# Altium footprint library RPSLib_orignal.PcbLib: 199 footprints (part 2 of 13)
Each footprint in its own frame and in the unit in brackets; x right, y up, seen from the top. Pads: shape width x height; smd on the part's side, far side on the other; paste and mask are expansions set on the pad; w line width, h text height; cw(c..) or ccw(c..) is an arc to the next point about the centre after c.
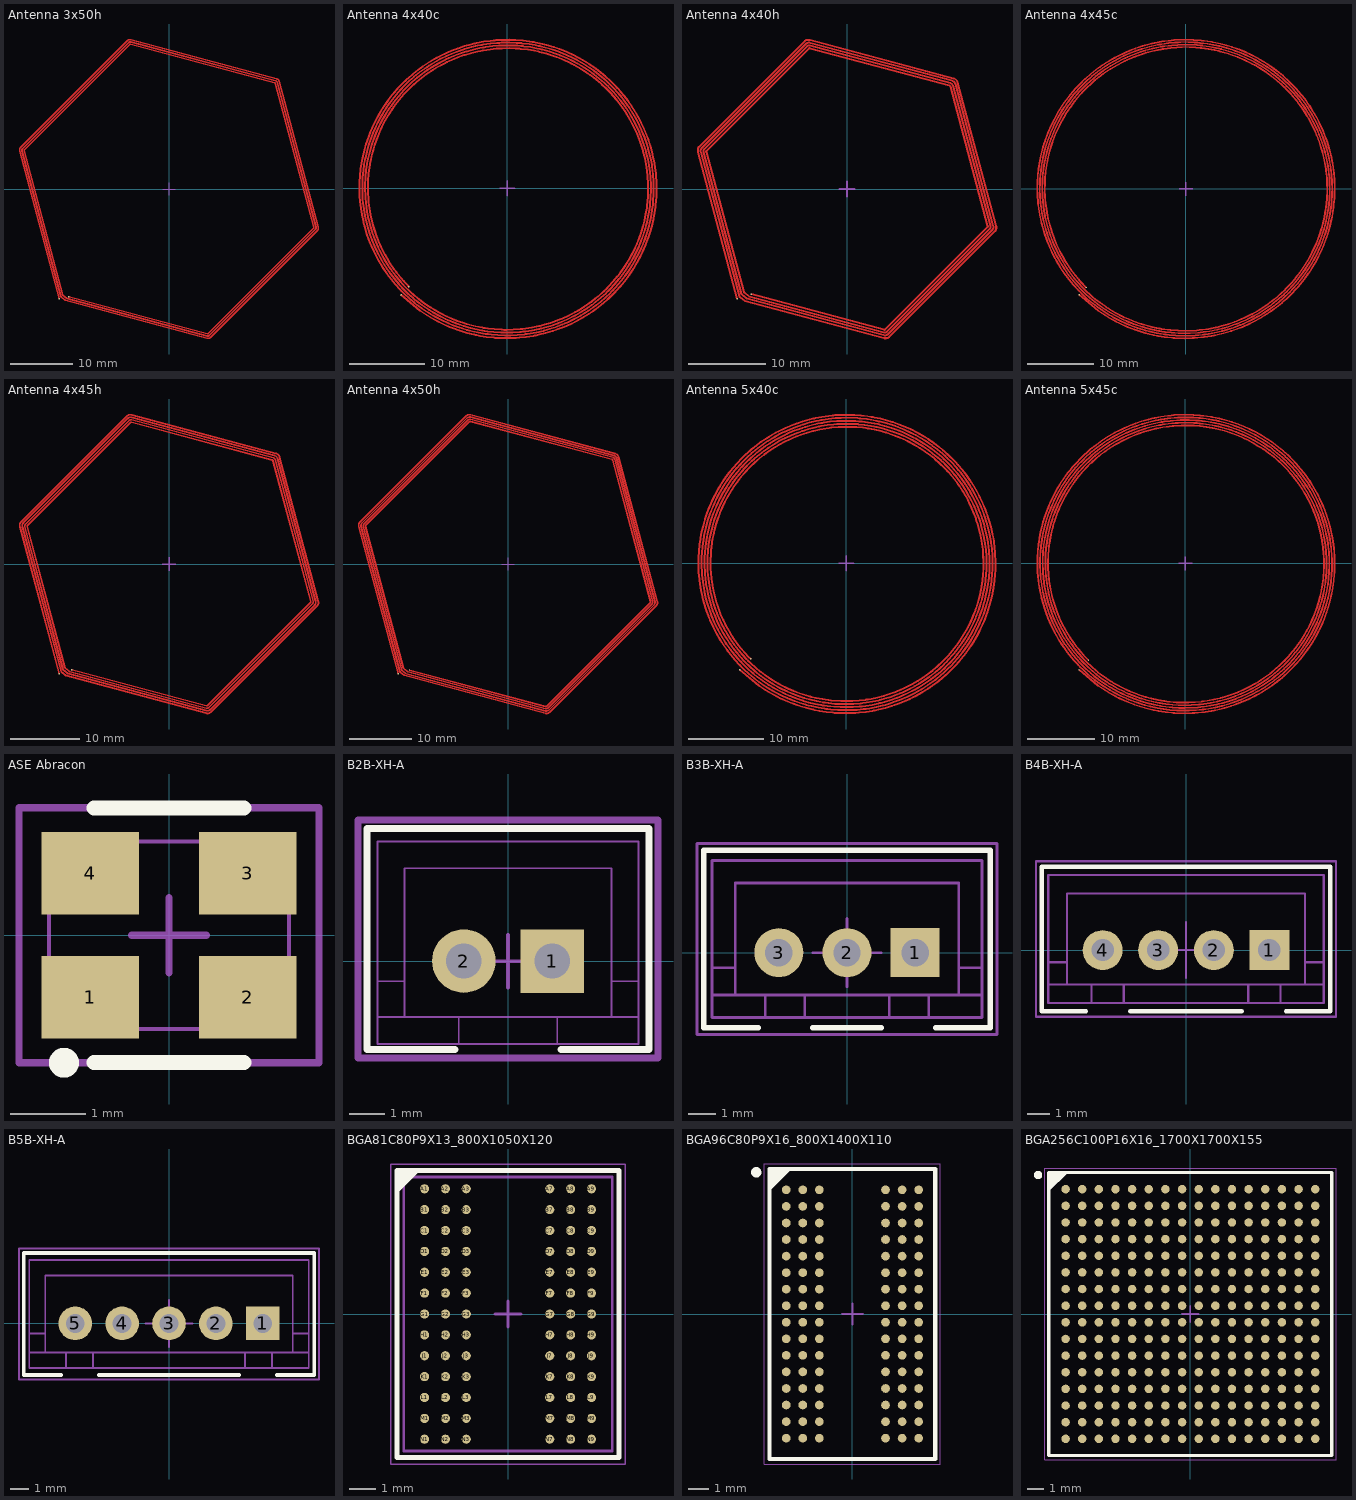
[diagram p1: the footprints below, top view; thin cyan lines are the x and y axes]

## Antenna 3x50h [mm] "Антенна гексагональная 3 витка, 50 мм"
pads (2):
  rect 0.2x0.2 smd mask+0.07: 1(-17.678,-17.678) 2(-16.146,-17.371)
Top Layer:
  region: 250 vertices and 0 holes, not listed, extent -24.179,-24.179 24.179,24.179
Mechanical 15:
  lines w0.2: -1,0 1,0 ; 0,-1 0,1

## Antenna 4x40c [mm] "Антенна спиральная 4 витка, 40 мм"
pads (2):
  rect 0.2x0.2 smd mask+0.07: 1(-14.142,-14.142) 2(-13.081,-13.081)
Top Layer:
  drawing of 1 lines, arcs and shapes, not listed
Mechanical 15:
  lines w0.2: -1,0 1,0 ; 0,-1 0,1

## Antenna 4x40h [mm] "Антенна гексагональная 4 витка, 40 мм"
pads (2):
  rect 0.2x0.2 smd mask+0.07: 1(-14.142,-14.142) 2(-12.328,-13.552)
Top Layer:
  region: 325 vertices and 0 holes, not listed, extent -19.326,-19.326 19.326,19.326
Mechanical 15:
  lines w0.2: -1,0 1,0 ; 0,-1 0,1

## Antenna 4x45c [mm] "Антенна спиральная 4 витка, 45 мм"
pads (2):
  rect 0.2x0.2 smd mask+0.07: 1(-15.994,-15.825) 2(-14.933,-14.765)
Top Layer:
  drawing of 1 lines, arcs and shapes, not listed
Mechanical 15:
  lines w0.2: -1,0 1,0 ; 0,-1 0,1

## Antenna 4x45h [mm] "Антенна гексагональная 4 витка, 45 мм"
pads (2):
  rect 0.2x0.2 smd mask+0.07: 1(-15.91,-15.91) 2(-14.095,-15.32)
Top Layer:
  region: 327 vertices and 0 holes, not listed, extent -21.741,-21.741 21.741,21.741
Mechanical 15:
  lines w0.2: -1,0 1,0 ; 0,-1 0,1

## Antenna 4x50h [mm] "Антенна гексагональная 4 витка, 50 мм"
pads (2):
  rect 0.2x0.2 smd mask+0.07: 1(-17.678,-17.678) 2(-15.863,-17.088)
Top Layer:
  region: 319 vertices and 0 holes, not listed, extent -24.156,-24.156 24.156,24.156
Mechanical 15:
  lines w0.2: -1,0 1,0 ; 0,-1 0,1

## Antenna 5x40c [mm] "Антенна спиральная 5 витков, 40 мм"
pads (2):
  rect 0.2x0.2 smd mask+0.07: 1(-14.142,-14.142) 2(-12.728,-12.728)
Top Layer:
  drawing of 1 lines, arcs and shapes, not listed
Mechanical 15:
  lines w0.2: -1,0 1,0 ; 0,-1 0,1

## Antenna 5x45c [mm] "Антенна спиральная 5 витков, 45 мм"
pads (2):
  rect 0.2x0.2 smd mask+0.07: 1(-15.91,-15.91) 2(-14.496,-14.496)
Top Layer:
  drawing of 1 lines, arcs and shapes, not listed
Mechanical 15:
  lines w0.2: -1,0 1,0 ; 0,-1 0,1

## ASE Abracon [mm]
height 1.2
pads (4):
  rect 1.3x1.1 smd mask+0.07: 1(-1.05,-0.825) 2(1.05,-0.825) 3(1.05,0.825) 4(-1.05,0.825)
Top Overlay:
  circle w0.2: c-1.4,-1.7 r0.1
  lines w0.2: -1,-1.7 1,-1.7 ; -1,1.7 1,1.7
Mechanical 13:
  lines w0.05: -1.6,-1.25 1.6,-1.25 1.6,1.25 -1.6,1.25 -1.6,-1.25
Mechanical 15:
  lines w0.1: -0.5,0 0.5,0 ; 0,-0.5 0,0.5 ; -2,-1.7 -2,1.7 2,1.7 2,-1.7 -2,-1.7
3D body "ASE.stp": height 1.2, standoff 0, extent -1.6,-1.25 1.6,1.25

## B2B-XH-A [mm] "2 pin connector"
height 7
pads (2):
  rect 1.8x1.8 hole 1 mask+0.07: 1(1.25,0)
  round 1.8 hole 1 mask+0.07: 2(-1.25,0)
Top Overlay:
  lines w0.2: -1.5,-2.5 -4,-2.5 -4,3.75 4,3.75 4,-2.5 1.5,-2.5
Mechanical 13:
  lines w0.05: -1.753,-2.349 1.753,-2.349 ; -1.753,-1.587 1.753,-1.587 ; -3.696,-1.587 -1.894,-1.587 -1.397,-1.587 -1.397,-2.349 -1.894,-2.349 -3.696,-2.349 -3.696,-1.587 ; -3.696,-1.587 -3.696,-0.572 ; -3.696,-1.587 -2.934,-1.587 -2.934,-0.572 ; -3.696,-0.572 -3.696,3.391 3.696,3.391 3.696,-0.572 ; -3.696,-0.572 -2.934,-0.572 ; -3.696,-0.572 -2.934,-0.572 ; -2.934,-0.572 -2.934,2.629 2.934,2.629 2.934,-0.572 ; 2.934,-0.572 3.696,-0.572 ; 2.934,-0.572 2.934,-1.587 3.696,-1.587 ; 2.934,-0.572 3.696,-0.572 ; 3.696,-1.587 1.894,-1.587 1.397,-1.587 1.397,-2.349 1.894,-2.349 3.696,-2.349 3.696,-1.587 ; 3.696,-1.587 3.696,-0.572
Mechanical 15:
  lines w0.1: -0.75,0 0.75,0 ; 0,-0.75 0,0.75
  lines w0.2: -4.25,-2.75 -4.25,4 4.25,4 4.25,-2.75 -4.25,-2.75
3D body "B2B-XH-A.stp": height 7.11, standoff -3.81, extent -3.696,-2.349 3.696,3.391

## B3B-XH-A [mm] "JST 3 pin connector XH"
height 7
pads (3):
  rect 1.8x1.8 hole 1 mask+0.07: 1(2.5,0)
  round 1.8 hole 1 mask+0.07: 2(0,0) 3(-2.5,0)
Top Overlay:
  lines w0.2: -3.25,-2.75 -5.25,-2.75 -5.25,3.75 5.25,3.75 5.25,-2.75 3.25,-2.75 ; -1.25,-2.75 1.25,-2.75
Mechanical 13:
  lines w0.1: -4.1,-1.55 -4.1,-0.55 ; 4.1,-1.55 4.1,-0.55 ; -4.95,-1.55 -4.95,-0.55 ; -4.95,-1.55 -4.95,-2.375 -3,-2.375 ; -4.95,-1.55 -3,-1.55 ; -4.95,-0.55 -4.95,3.375 4.95,3.375 4.95,-0.55 ; -4.95,-0.55 -4.1,-0.55 ; -4.1,-0.55 -4.1,2.55 4.1,2.55 4.1,-0.55 ; -3,-2.375 -3,-1.55 ; -3,-2.375 -1.55,-2.375 ; -3,-1.55 -1.55,-1.55 ; -1.55,-2.375 -1.55,-1.55 ; -1.55,-2.375 1.55,-2.375 ; -1.55,-1.55 1.55,-1.55 ; 1.55,-2.375 1.55,-1.55 ; 1.55,-2.375 3,-2.375 ; 1.55,-1.55 3,-1.55 ; 3,-2.375 3,-1.55 ; 3,-2.375 4.95,-2.375 4.95,-1.55 ; 3,-1.55 4.95,-1.55 ; 4.1,-0.55 4.95,-0.55 ; 4.95,-1.55 4.95,-0.55
Mechanical 15:
  lines w0.1: -1.25,0 1.25,0 ; 0,-1.25 0,1.25 ; -5.5,-3 5.5,-3 5.5,4 -5.5,4 -5.5,-3
3D body "B3B-XH-A.stp": height 7, standoff -3.4, extent -4.95,-2.375 4.95,3.375

## B4B-XH-A [mm] "JST 4 pin connector"
height 7
pads (4):
  rect 1.8x1.8 hole 1 mask+0.07: 1(3.75,0)
  round 1.8 hole 1 mask+0.07: 2(1.25,0) 3(-1.25,0) 4(-3.75,0)
Top Overlay:
  lines w0.2: -4.5,-2.75 -6.5,-2.75 -6.5,3.75 6.5,3.75 6.5,-2.75 4.5,-2.75 ; -2.5,-2.75 2.5,-2.75
Mechanical 13:
  lines w0.1: -5.35,-1.55 -5.35,-0.55 ; 5.35,-1.55 5.35,-0.55 ; -6.2,-1.55 -4.25,-1.55 ; -6.2,-1.55 -6.2,-2.375 -4.25,-2.375 ; -6.2,-1.55 -6.2,-0.55 ; -6.2,-0.55 -5.35,-0.55 ; -6.2,-0.55 -6.2,3.375 6.2,3.375 6.2,-0.55 ; -5.35,-0.55 -5.35,2.55 5.35,2.55 5.35,-0.55 ; -4.25,-2.375 -2.8,-2.375 ; -4.25,-2.375 -4.25,-1.55 ; -4.25,-1.55 -2.8,-1.55 ; -2.8,-2.375 2.8,-2.375 ; -2.8,-2.375 -2.8,-1.55 ; -2.8,-1.55 2.8,-1.55 ; 2.8,-2.375 4.25,-2.375 ; 2.8,-2.375 2.8,-1.55 ; 2.8,-1.55 4.25,-1.55 ; 4.25,-2.375 6.2,-2.375 6.2,-1.55 ; 4.25,-2.375 4.25,-1.55 ; 4.25,-1.55 6.2,-1.55 ; 5.35,-0.55 6.2,-0.55 ; 6.2,-1.55 6.2,-0.55 ; -4.07,-0.32 -4.07,0.32 -3.43,0.32 -3.43,-0.32 -4.07,-0.32 ; -1.57,-0.32 -1.57,0.32 -0.93,0.32 -0.93,-0.32 -1.57,-0.32 ; 0.93,-0.32 0.93,0.32 1.57,0.32 1.57,-0.32 0.93,-0.32 ; 3.43,-0.32 4.07,-0.32 4.07,0.32 3.43,0.32 3.43,-0.32
Mechanical 15:
  lines w0.1: -1.25,0 1.25,0 ; 0,-1.25 0,1.25 ; -6.75,-3 -6.75,4 6.75,4 6.75,-3 -6.75,-3
3D body "B4B-XH-A.stp": height 7, standoff -3.4, extent -6.2,-2.375 6.2,3.375

## B5B-XH-A [mm] "JST 5 pin connector XH"
height 7
pads (5):
  rect 1.8x1.8 hole 1 mask+0.07: 1(5,0)
  round 1.8 hole 1 mask+0.07: 2(2.5,0) 3(0,0) 4(-2.5,0) 5(-5,0)
Top Overlay:
  lines w0.2: -5.75,-2.75 -7.75,-2.75 -7.75,3.75 7.75,3.75 7.75,-2.75 5.75,-2.75 ; -3.75,-2.75 3.75,-2.75
Mechanical 13:
  lines w0.1: -6.6,-1.55 -6.6,-0.55 ; 6.6,-1.55 6.6,-0.55 ; -7.45,-1.55 -7.45,-0.55 ; -7.45,-1.55 -7.45,-2.375 -5.5,-2.375 ; -7.45,-1.55 -5.5,-1.55 ; -7.45,-0.55 -6.6,-0.55 ; -7.45,-0.55 -7.45,3.375 7.45,3.375 7.45,-0.55 ; -6.6,-0.55 -6.6,2.55 6.6,2.55 6.6,-0.55 ; -5.5,-2.375 -5.5,-1.55 ; -5.5,-2.375 -4.05,-2.375 ; -5.5,-1.55 -4.05,-1.55 ; -4.05,-2.375 -4.05,-1.55 ; -4.05,-2.375 4.05,-2.375 ; -4.05,-1.55 4.05,-1.55 ; 4.05,-2.375 5.5,-2.375 ; 4.05,-2.375 4.05,-1.55 ; 4.05,-1.55 5.5,-1.55 ; 5.5,-2.375 5.5,-1.55 ; 5.5,-2.375 7.45,-2.375 7.45,-1.55 ; 5.5,-1.55 7.45,-1.55 ; 6.6,-0.55 7.45,-0.55 ; 7.45,-1.55 7.45,-0.55
Mechanical 15:
  lines w0.1: -1.25,0 1.25,0 ; 0,-1.25 0,1.25 ; -8,-3 -8,4 8,4 8,-3 -8,-3
3D body "B5B-XH-A.stp": height 7, standoff -3.4, extent -7.45,-2.375 7.45,3.375

## BGA81C80P9X13_800X1050X120 [mm] "BGA, 81-Leads, Body 8,00x10,50mmx1,20mm, Pitch 0,80mm"
height 1.2
pads (78):
  round 0.35 smd mask+0.05: A1(-3.2,4.8) A2(-2.4,4.8) A3(-1.6,4.8) A7(1.6,4.8) A8(2.4,4.8) A9(3.2,4.8) B1(-3.2,4) B2(-2.4,4) B3(-1.6,4) B7(1.6,4) B8(2.4,4) B9(3.2,4) C1(-3.2,3.2) C2(-2.4,3.2) C3(-1.6,3.2) C7(1.6,3.2) C8(2.4,3.2) C9(3.2,3.2) D1(-3.2,2.4) D2(-2.4,2.4) D3(-1.6,2.4) D7(1.6,2.4) D8(2.4,2.4) D9(3.2,2.4) E1(-3.2,1.6) E2(-2.4,1.6) E3(-1.6,1.6) E7(1.6,1.6) E8(2.4,1.6) E9(3.2,1.6) F1(-3.2,0.8) F2(-2.4,0.8) F3(-1.6,0.8) F7(1.6,0.8) F8(2.4,0.8) F9(3.2,0.8) G1(-3.2,0) G2(-2.4,0) G3(-1.6,0) G7(1.6,0) G8(2.4,0) G9(3.2,0) H1(-3.2,-0.8) H2(-2.4,-0.8) H3(-1.6,-0.8) H7(1.6,-0.8) H8(2.4,-0.8) H9(3.2,-0.8) J1(-3.2,-1.6) J2(-2.4,-1.6) J3(-1.6,-1.6) J7(1.6,-1.6) J8(2.4,-1.6) J9(3.2,-1.6) K1(-3.2,-2.4) K2(-2.4,-2.4) K3(-1.6,-2.4) K7(1.6,-2.4) K8(2.4,-2.4) K9(3.2,-2.4) L1(-3.2,-3.2) L2(-2.4,-3.2) L3(-1.6,-3.2) L7(1.6,-3.2) L8(2.4,-3.2) L9(3.2,-3.2) M1(-3.2,-4) M2(-2.4,-4) M3(-1.6,-4) M7(1.6,-4) M8(2.4,-4) M9(3.2,-4) N1(-3.2,-4.8) N2(-2.4,-4.8) N3(-1.6,-4.8) N7(1.6,-4.8) N8(2.4,-4.8) N9(3.2,-4.8)
Top Overlay:
  lines w0.2: -4.25,4.75 -3.5,5.5 ; -4.25,5 -3.75,5.5 ; -4.25,5.25 -4,5.5 ; -4.25,-5.5 4.25,-5.5 4.25,5.5 -4.25,5.5 -4.25,-5.5
Mechanical 13:
  lines w0.1: -4,-5.25 4,-5.25 4,5.25 -4,5.25 -4,-5.25
Mechanical 15:
  lines w0.05: -4.5,-5.75 4.5,-5.75 4.5,5.75 -4.5,5.75 -4.5,-5.75
  lines w0.1: -0.5,0 0.5,0 ; 0,-0.5 0,0.5
3D body "MT41JxxxM8.stp": height 1.06, standoff 0, extent -4,-5.25 4,5.25

## BGA96C80P9X16_800X1400X110 [mm] "BGA, 96-Leads, Body 8,00x14,00mmx1,10mm, Pitch 0,80mm"
height 1.1
pads (96):
  round 0.42 smd: A1(-3.2,6) A2(-2.4,6) A3(-1.6,6) A7(1.6,6) A8(2.4,6) A9(3.2,6) B1(-3.2,5.2) B2(-2.4,5.2) B3(-1.6,5.2) B7(1.6,5.2) B8(2.4,5.2) B9(3.2,5.2) C1(-3.2,4.4) C2(-2.4,4.4) C3(-1.6,4.4) C7(1.6,4.4) C8(2.4,4.4) C9(3.2,4.4) D1(-3.2,3.6) D2(-2.4,3.6) D3(-1.6,3.6) D7(1.6,3.6) D8(2.4,3.6) D9(3.2,3.6) E1(-3.2,2.8) E2(-2.4,2.8) E3(-1.6,2.8) E7(1.6,2.8) E8(2.4,2.8) E9(3.2,2.8) F1(-3.2,2) F2(-2.4,2) F3(-1.6,2) F7(1.6,2) F8(2.4,2) F9(3.2,2) G1(-3.2,1.2) G2(-2.4,1.2) G3(-1.6,1.2) G7(1.6,1.2) G8(2.4,1.2) G9(3.2,1.2) H1(-3.2,0.4) H2(-2.4,0.4) H3(-1.6,0.4) H7(1.6,0.4) H8(2.4,0.4) H9(3.2,0.4) J1(-3.2,-0.4) J2(-2.4,-0.4) J3(-1.6,-0.4) J7(1.6,-0.4) J8(2.4,-0.4) J9(3.2,-0.4) K1(-3.2,-1.2) K2(-2.4,-1.2) K3(-1.6,-1.2) K7(1.6,-1.2) K8(2.4,-1.2) K9(3.2,-1.2) L1(-3.2,-2) L2(-2.4,-2) L3(-1.6,-2) L7(1.6,-2) L8(2.4,-2) L9(3.2,-2) M1(-3.2,-2.8) M2(-2.4,-2.8) M3(-1.6,-2.8) M7(1.6,-2.8) M8(2.4,-2.8) M9(3.2,-2.8) N1(-3.2,-3.6) N2(-2.4,-3.6) N3(-1.6,-3.6) N7(1.6,-3.6) N8(2.4,-3.6) N9(3.2,-3.6) P1(-3.2,-4.4) P2(-2.4,-4.4) P3(-1.6,-4.4) P7(1.6,-4.4) P8(2.4,-4.4) P9(3.2,-4.4) R1(-3.2,-5.2) R2(-2.4,-5.2) R3(-1.6,-5.2) R7(1.6,-5.2) R8(2.4,-5.2) R9(3.2,-5.2) T1(-3.2,-6) T2(-2.4,-6) T3(-1.6,-6) T7(1.6,-6) T8(2.4,-6) T9(3.2,-6)
Top Overlay:
  circle w0.25: c-4.65,6.85 r0.125
  region: -3.063,7 -4,6.063 -4,7
  lines w0.2: -4,6.063 -3.063,7 ; -4,-7 -4,7 4,7 4,-7 -4,-7
Mechanical 13:
  lines w0.1: -4,-7 -4,7 4,7 4,-7 -4,-7
Mechanical 15:
  lines w0.05: -4.25,-7.25 -4.25,7.25 4.25,7.25 4.25,-7.25 -4.25,-7.25
  lines w0.1: -0.5,0 0.5,0 ; 0,-0.5 0,0.5
3D body "MT41JxxxM16.stp": height 1.06, standoff 0, extent -4,-7 4,7

## BGA256C100P16X16_1700X1700X155 [mm] "BGA, 256-Leads, Body 17,00x17,00mmx1,55mm, Pitch 1,00mm"
height 1.55
pads (256):
  round 0.51 smd mask+0.015: A1(-7.5,7.5) A2(-6.5,7.5) A3(-5.5,7.5) A4(-4.5,7.5) A5(-3.5,7.5) A6(-2.5,7.5) A7(-1.5,7.5) A8(-0.5,7.5) A9(0.5,7.5) A10(1.5,7.5) A11(2.5,7.5) A12(3.5,7.5) A13(4.5,7.5) A14(5.5,7.5) A15(6.5,7.5) A16(7.5,7.5) B1(-7.5,6.5) B2(-6.5,6.5) B3(-5.5,6.5) B4(-4.5,6.5) B5(-3.5,6.5) B6(-2.5,6.5) B7(-1.5,6.5) B8(-0.5,6.5) B9(0.5,6.5) B10(1.5,6.5) B11(2.5,6.5) B12(3.5,6.5) B13(4.5,6.5) B14(5.5,6.5) B15(6.5,6.5) B16(7.5,6.5) C1(-7.5,5.5) C2(-6.5,5.5) C3(-5.5,5.5) C4(-4.5,5.5) C5(-3.5,5.5) C6(-2.5,5.5) C7(-1.5,5.5) C8(-0.5,5.5) C9(0.5,5.5) C10(1.5,5.5) C11(2.5,5.5) C12(3.5,5.5) C13(4.5,5.5) C14(5.5,5.5) C15(6.5,5.5) C16(7.5,5.5) D1(-7.5,4.5) D2(-6.5,4.5) D3(-5.5,4.5) D4(-4.5,4.5) D5(-3.5,4.5) D6(-2.5,4.5) D7(-1.5,4.5) D8(-0.5,4.5) D9(0.5,4.5) D10(1.5,4.5) D11(2.5,4.5) D12(3.5,4.5) D13(4.5,4.5) D14(5.5,4.5) D15(6.5,4.5) D16(7.5,4.5) E1(-7.5,3.5) E2(-6.5,3.5) E3(-5.5,3.5) E4(-4.5,3.5) E5(-3.5,3.5) E6(-2.5,3.5) E7(-1.5,3.5) E8(-0.5,3.5) E9(0.5,3.5) E10(1.5,3.5) E11(2.5,3.5) E12(3.5,3.5) E13(4.5,3.5) E14(5.5,3.5) E15(6.5,3.5) E16(7.5,3.5) F1(-7.5,2.5) F2(-6.5,2.5) F3(-5.5,2.5) F4(-4.5,2.5) F5(-3.5,2.5) F6(-2.5,2.5) F7(-1.5,2.5) F8(-0.5,2.5) F9(0.5,2.5) F10(1.5,2.5) F11(2.5,2.5) F12(3.5,2.5) F13(4.5,2.5) F14(5.5,2.5) F15(6.5,2.5) F16(7.5,2.5) G1(-7.5,1.5) G2(-6.5,1.5) G3(-5.5,1.5) G4(-4.5,1.5) G5(-3.5,1.5) G6(-2.5,1.5) G7(-1.5,1.5) G8(-0.5,1.5) G9(0.5,1.5) G10(1.5,1.5) G11(2.5,1.5) G12(3.5,1.5) G13(4.5,1.5) G14(5.5,1.5) G15(6.5,1.5) G16(7.5,1.5) H1(-7.5,0.5) H2(-6.5,0.5) H3(-5.5,0.5) H4(-4.5,0.5) H5(-3.5,0.5) H6(-2.5,0.5) H7(-1.5,0.5) H8(-0.5,0.5) H9(0.5,0.5) H10(1.5,0.5) H11(2.5,0.5) H12(3.5,0.5) H13(4.5,0.5) H14(5.5,0.5) H15(6.5,0.5) H16(7.5,0.5) J1(-7.5,-0.5) J2(-6.5,-0.5) J3(-5.5,-0.5) J4(-4.5,-0.5) J5(-3.5,-0.5) J6(-2.5,-0.5) J7(-1.5,-0.5) J8(-0.5,-0.5) J9(0.5,-0.5) J10(1.5,-0.5) J11(2.5,-0.5) J12(3.5,-0.5) J13(4.5,-0.5) J14(5.5,-0.5) J15(6.5,-0.5) J16(7.5,-0.5) K1(-7.5,-1.5) K2(-6.5,-1.5) K3(-5.5,-1.5) K4(-4.5,-1.5) K5(-3.5,-1.5) K6(-2.5,-1.5) K7(-1.5,-1.5) K8(-0.5,-1.5) K9(0.5,-1.5) K10(1.5,-1.5) K11(2.5,-1.5) K12(3.5,-1.5) K13(4.5,-1.5) K14(5.5,-1.5) K15(6.5,-1.5) K16(7.5,-1.5) L1(-7.5,-2.5) L2(-6.5,-2.5) L3(-5.5,-2.5) L4(-4.5,-2.5) L5(-3.5,-2.5) L6(-2.5,-2.5) L7(-1.5,-2.5) L8(-0.5,-2.5) L9(0.5,-2.5) L10(1.5,-2.5) L11(2.5,-2.5) L12(3.5,-2.5) L13(4.5,-2.5) L14(5.5,-2.5) L15(6.5,-2.5) L16(7.5,-2.5) M1(-7.5,-3.5) M2(-6.5,-3.5) M3(-5.5,-3.5) M4(-4.5,-3.5) M5(-3.5,-3.5) M6(-2.5,-3.5) M7(-1.5,-3.5) M8(-0.5,-3.5) M9(0.5,-3.5) M10(1.5,-3.5) M11(2.5,-3.5) M12(3.5,-3.5) M13(4.5,-3.5) M14(5.5,-3.5) M15(6.5,-3.5) M16(7.5,-3.5) N1(-7.5,-4.5) N2(-6.5,-4.5) N3(-5.5,-4.5) N4(-4.5,-4.5) N5(-3.5,-4.5) N6(-2.5,-4.5) N7(-1.5,-4.5) N8(-0.5,-4.5) N9(0.5,-4.5) N10(1.5,-4.5) N11(2.5,-4.5) N12(3.5,-4.5) N13(4.5,-4.5) N14(5.5,-4.5) N15(6.5,-4.5) N16(7.5,-4.5) P1(-7.5,-5.5) P2(-6.5,-5.5) P3(-5.5,-5.5) P4(-4.5,-5.5) P5(-3.5,-5.5) P6(-2.5,-5.5) P7(-1.5,-5.5) P8(-0.5,-5.5) P9(0.5,-5.5) P10(1.5,-5.5) P11(2.5,-5.5) P12(3.5,-5.5) P13(4.5,-5.5) P14(5.5,-5.5) P15(6.5,-5.5) P16(7.5,-5.5) R1(-7.5,-6.5) R2(-6.5,-6.5) R3(-5.5,-6.5) R4(-4.5,-6.5) R5(-3.5,-6.5) R6(-2.5,-6.5) R7(-1.5,-6.5) R8(-0.5,-6.5) R9(0.5,-6.5) R10(1.5,-6.5) R11(2.5,-6.5) R12(3.5,-6.5) R13(4.5,-6.5) R14(5.5,-6.5) R15(6.5,-6.5) R16(7.5,-6.5) T1(-7.5,-7.5) T2(-6.5,-7.5) T3(-5.5,-7.5) T4(-4.5,-7.5) T5(-3.5,-7.5) T6(-2.5,-7.5) T7(-1.5,-7.5) T8(-0.5,-7.5) T9(0.5,-7.5) T10(1.5,-7.5) T11(2.5,-7.5) T12(3.5,-7.5) T13(4.5,-7.5) T14(5.5,-7.5) T15(6.5,-7.5) T16(7.5,-7.5)
Top Overlay:
  circle w0.25: c-9.15,8.35 r0.125
  region: -7.5,8.5 -8.5,7.5 -8.5,8.5
  lines w0.2: -8.5,7.5 -7.5,8.5 ; -8.5,-8.5 -8.5,8.5 8.5,8.5 8.5,-8.5 -8.5,-8.5
Mechanical 13:
  lines w0.1: -8.5,-8.5 -8.5,8.5 8.5,8.5 8.5,-8.5 -8.5,-8.5
Mechanical 15:
  lines w0.05: -8.75,-8.75 -8.75,8.75 8.75,8.75 8.75,-8.75 -8.75,-8.75
  lines w0.1: -0.5,0 0.5,0 ; 0,-0.5 0,0.5
3D body "BGA256C100P16X16_1700X1700X155.step": height 1.55, standoff 0, extent -8.5,-8.5 8.5,8.5